# Altium schematic symbol library FPGA_Xilinx_Virtex7.SchLib: 34 symbols (part 4 of 34)
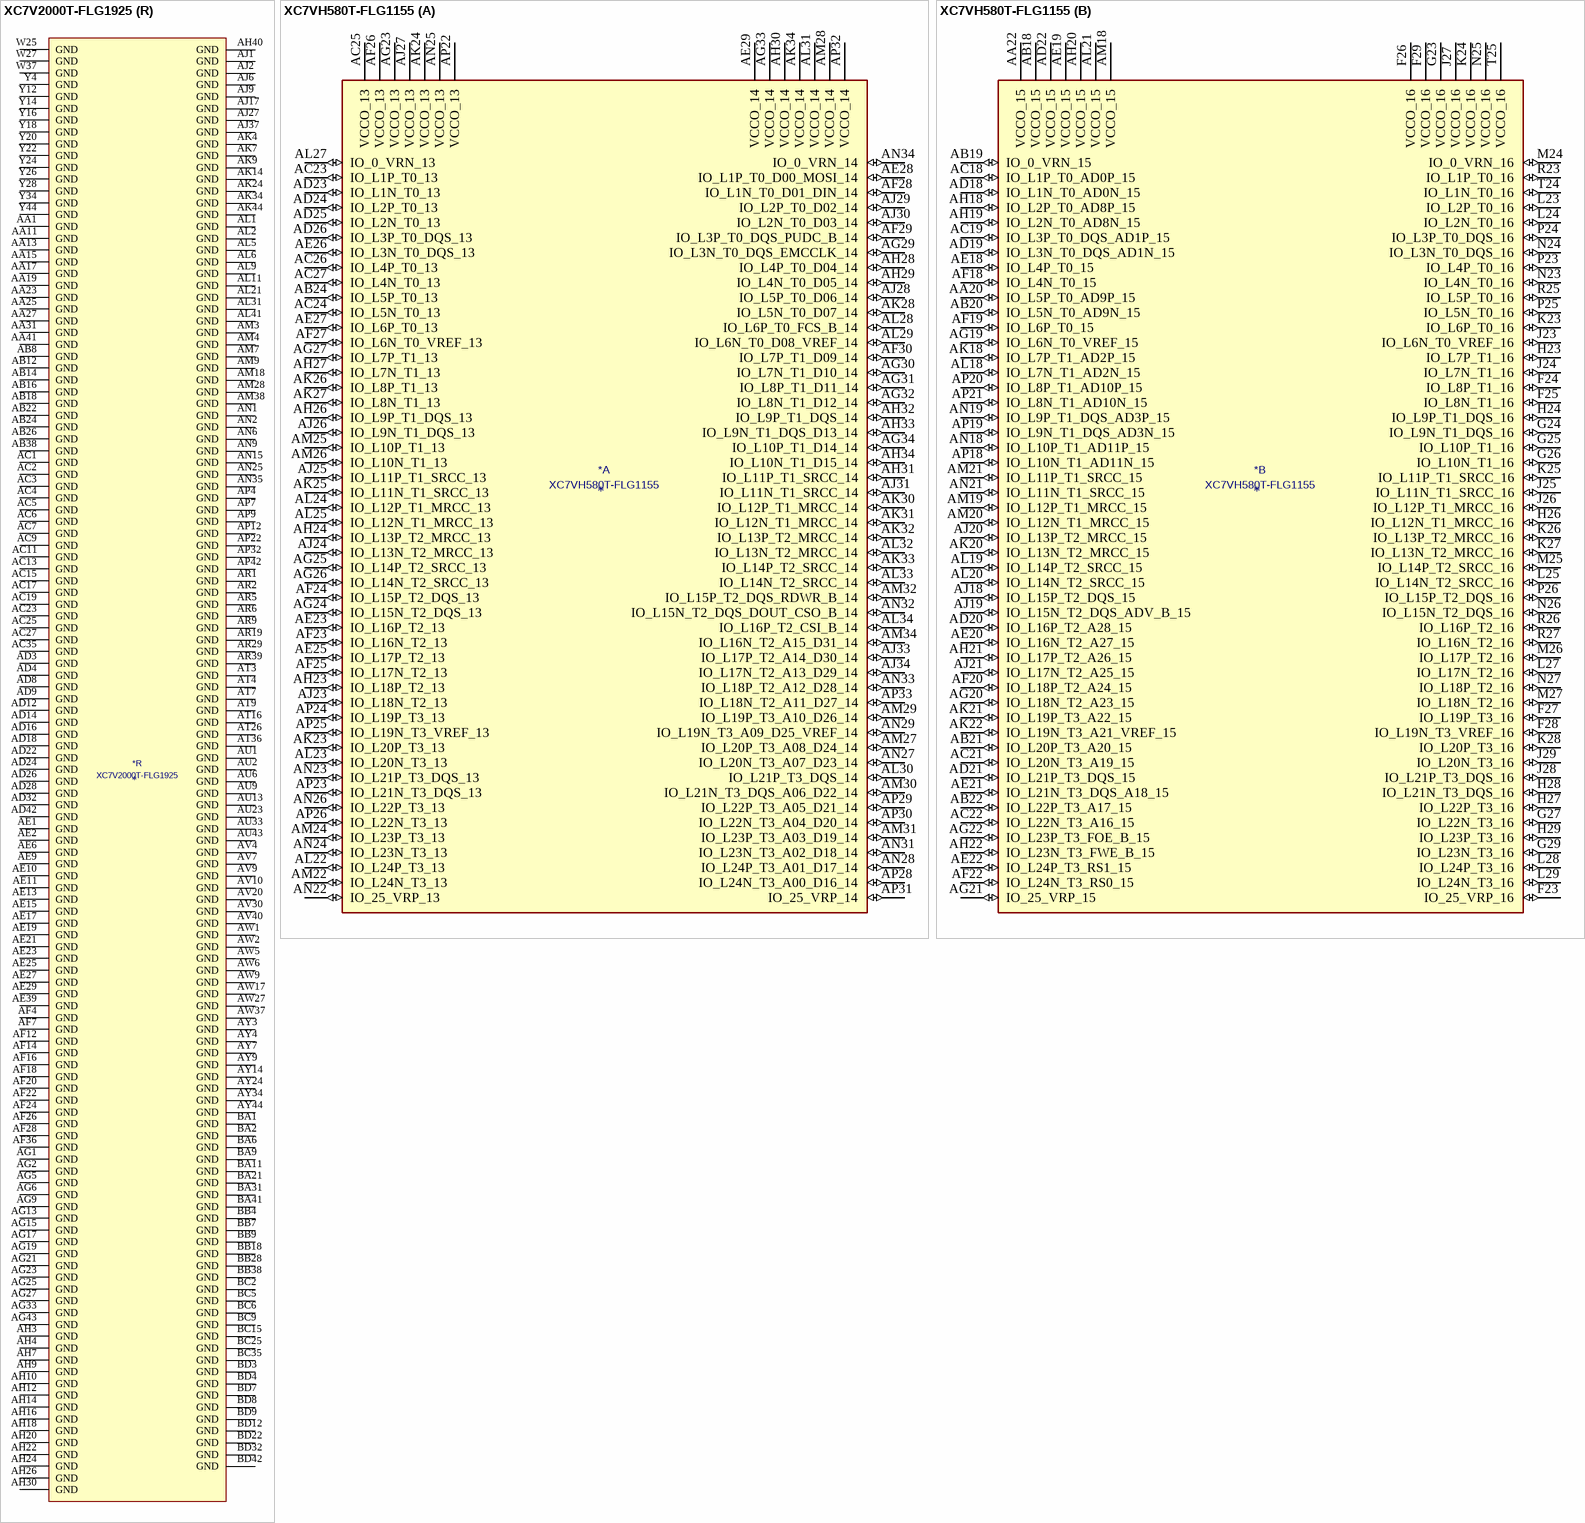
[diagram p175: symbols XC7V2000T-FLG1925 to XC7VH580T-FLG1155]

## XC7V2000T-FLG1925
designator *  value XC7V2000T-FLG1925
ki_keywords: FPGA; ki_description: Virtex 7 T 2000 XC7V2000T-FLG1925
part A pins: AN34 IO_0_VRN_12 (io), AN36 IO_L6P_T0_12 (io), AN37 IO_L2P_T0_12 (io), AN38 IO_L2N_T0_12 (io), AN39 IO_L7P_T1_12 (io), AN40 VCCO_12 (power), AN41 IO_L9P_T1_DQS_12 (io), AP34 IO_L3P_T0_DQS_12 (io), AP35 IO_L3N_T0_DQS_12 (io), AP36 IO_L6N_T0_VREF_12 (io), AP37 VCCO_12 (power), AP38 IO_L4P_T0_12 (io), AP39 IO_L4N_T0_12 (io), AP40 IO_L7N_T1_12 (io), AP41 IO_L9N_T1_DQS_12 (io), AP43 IO_L8P_T1_12 (io), AP44 IO_L8N_T1_12 (io), AR34 VCCO_12 (power), AR35 IO_L5P_T0_12 (io), AR36 IO_L5N_T0_12 (io), AR37 IO_L1P_T0_12 (io), AR38 IO_L1N_T0_12 (io), AR40 IO_L11P_T1_SRCC_12 (io), AR41 IO_L11N_T1_SRCC_12 (io), AR42 IO_L12P_T1_MRCC_12 (io), AR43 IO_L10P_T1_12 (io), AR44 VCCO_12 (power), AT34 IO_25_VRP_12 (io), AT35 IO_L20P_T3_12 (io), AT37 IO_L19P_T3_12 (io), AT38 IO_L19N_T3_VREF_12 (io), AT39 IO_L14P_T2_SRCC_12 (io), AT40 IO_L14N_T2_SRCC_12 (io), AT41 VCCO_12 (power), AT42 IO_L12N_T1_MRCC_12 (io), AT43 IO_L10N_T1_12 (io), AT44 IO_L16P_T2_12 (io), AU34 IO_L22P_T3_12 (io), AU35 IO_L20N_T3_12 (io), AU36 IO_L21P_T3_DQS_12 (io), AU37 IO_L21N_T3_DQS_12 (io), AU38 VCCO_12 (power), AU39 IO_L13P_T2_MRCC_12 (io), AU40 IO_L13N_T2_MRCC_12 (io), AU41 IO_L15P_T2_DQS_12 (io), AU42 IO_L17P_T2_12 (io), AU44 IO_L16N_T2_12 (io), AV34 IO_L22N_T3_12 (io), AV35 VCCO_12 (power), AV36 IO_L24P_T3_12 (io), AV37 IO_L24N_T3_12 (io), AV38 IO_L23P_T3_12 (io), AV39 IO_L23N_T3_12 (io), AV41 IO_L15N_T2_DQS_12 (io), AV42 IO_L17N_T2_12 (io), AV43 IO_L18P_T2_12 (io), AV44 IO_L18N_T2_12 (io), AW34 IO_25_VRP_11 (io), AW35 IO_L20P_T3_11 (io), AW36 IO_0_VRN_11 (io), AW38 IO_L15P_T2_DQS_11 (io), AW39 IO_L15N_T2_DQS_11 (io), AW40 IO_L1P_T0_11 (io), AW41 IO_L1N_T0_11 (io), AW42 VCCO_11 (power), AW43 IO_L3P_T0_DQS_11 (io), AW44 IO_L3N_T0_DQS_11 (io), AY35 IO_L20N_T3_11 (io), AY36 IO_L18P_T2_11 (io), AY37 IO_L18N_T2_11 (io), AY38 IO_L13P_T2_MRCC_11 (io), AY39 VCCO_11 (power), AY40 IO_L12P_T1_MRCC_11 (io), AY41 IO_L5P_T0_11 (io), AY42 IO_L5N_T0_11 (io), AY43 IO_L2P_T0_11 (io), BA34 IO_L19P_T3_11 (io), BA35 IO_L22P_T3_11 (io), BA36 VCCO_11 (power), BA37 IO_L14P_T2_SRCC_11 (io), BA38 IO_L14N_T2_SRCC_11 (io), BA39 IO_L13N_T2_MRCC_11 (io), BA40 IO_L12N_T1_MRCC_11 (io), BA42 IO_L6P_T0_11 (io), BA43 IO_L2N_T0_11 (io), BA44 IO_L4P_T0_11 (io), BB34 IO_L19N_T3_VREF_11 (io), BB35 IO_L22N_T3_11 (io), BB36 IO_L24P_T3_11 (io), BB37 IO_L16P_T2_11 (io), BB39 IO_L11P_T1_SRCC_11 (io), BB40 IO_L11N_T1_SRCC_11 (io), BB41 IO_L7P_T1_11 (io), BB42 IO_L6N_T0_VREF_11 (io), BB43 VCCO_11 (power), BB44 IO_L4N_T0_11 (io), BC34 IO_L23P_T3_11 (io), BC36 IO_L24N_T3_11 (io), BC37 IO_L16N_T2_11 (io), BC38 IO_L17P_T2_11 (io), BC39 IO_L10P_T1_11 (io), BC40 VCCO_11 (power), BC41 IO_L7N_T1_11 (io), BC42 IO_L9P_T1_DQS_11 (io), BC43 IO_L9N_T1_DQS_11 (io), BD34 IO_L23N_T3_11 (io), BD35 IO_L21P_T3_DQS_11 (io), BD36 IO_L21N_T3_DQS_11 (io), BD37 VCCO_11 (power), BD38 IO_L17N_T2_11 (io), BD39 IO_L10N_T1_11 (io), BD40 IO_L8P_T1_11 (io), BD41 IO_L8N_T1_11 (io)
part B pins: AD41 IO_L13P_T2_MRCC_14 (io), AD43 IO_L15P_T2_DQS_RDWR_B_14 (io), AD44 IO_L15N_T2_DQS_DOUT_CSO_B_14 (io), AE30 IO_L20P_T3_A08_D24_14 (io), AE31 IO_L20N_T3_A07_D23_14 (io), AE32 IO_L4P_T0_D04_14 (io), AE33 IO_L4N_T0_D05_14 (io), AE34 VCCO_14 (power), AE35 IO_L6P_T0_FCS_B_14 (io), AE36 IO_0_VRN_14 (io), AE37 IO_L8P_T1_D11_14 (io), AE38 IO_L8N_T1_D12_14 (io), AE40 IO_L12P_T1_MRCC_14 (io), AE41 IO_L13N_T2_MRCC_14 (io), AE42 IO_L14P_T2_SRCC_14 (io), AE43 IO_L17P_T2_A14_D30_14 (io), AE44 VCCO_14 (power), AF29 IO_L22P_T3_A05_D21_14 (io), AF30 IO_L22N_T3_A04_D20_14 (io), AF31 VCCO_14 (power), AF32 IO_L5P_T0_D06_14 (io), AF33 IO_L1P_T0_D00_MOSI_14 (io), AF34 IO_L1N_T0_D01_DIN_14 (io), AF35 IO_L6N_T0_D08_VREF_14 (io), AF37 IO_L10P_T1_D14_14 (io), AF38 IO_L10N_T1_D15_14 (io), AF39 IO_L11P_T1_SRCC_14 (io), AF40 IO_L12N_T1_MRCC_14 (io), AF41 VCCO_14 (power), AF42 IO_L14N_T2_SRCC_14 (io), AF43 IO_L17N_T2_A13_D29_14 (io), AF44 IO_L18P_T2_A12_D28_14 (io), AG29 IO_L19P_T3_A10_D26_14 (io), AG30 IO_L19N_T3_A09_D25_VREF_14 (io), AG31 IO_L24P_T3_A01_D17_14 (io), AG32 IO_L5N_T0_D07_14 (io), AG34 IO_L2P_T0_D02_14 (io), AG35 IO_L2N_T0_D03_14 (io), AG36 IO_L3P_T0_DQS_PUDC_B_14 (io), AG37 IO_L3N_T0_DQS_EMCCLK_14 (io), AG38 VCCO_14 (power), AG39 IO_L9P_T1_DQS_14 (io), AG40 IO_L11N_T1_SRCC_14 (io), AG41 IO_L7P_T1_D09_14 (io), AG42 IO_L16P_T2_CSI_B_14 (io), AG44 IO_L18N_T2_A11_D27_14 (io), AH28 IO_L21P_T3_DQS_14 (io), AH29 IO_L21N_T3_DQS_A06_D22_14 (io), AH31 IO_L24N_T3_A00_D16_14 (io), AH32 IO_L23P_T3_13 (io), AH33 IO_L23N_T3_13 (io), AH34 IO_0_VRN_13 (io), AH35 VCCO_13 (power), AH36 IO_L7P_T1_13 (io), AH37 IO_L8P_T1_13 (io), AH38 IO_L8N_T1_13 (io), AH39 IO_L9N_T1_DQS_D13_14 (io), AH41 IO_L7N_T1_D10_14 (io), AH42 IO_L16N_T2_A15_D31_14 (io), AH43 IO_L2P_T0_13 (io), AH44 IO_L2N_T0_13 (io), AJ28 IO_25_VRP_14 (io), AJ29 IO_L23P_T3_A03_D19_14 (io), AJ30 IO_L23N_T3_A02_D18_14 (io), AJ31 IO_25_VRP_13 (io), AJ32 VCCO_13 (power), AJ33 IO_L19P_T3_13 (io), AJ34 IO_L19N_T3_VREF_13 (io), AJ35 IO_L20P_T3_13 (io), AJ36 IO_L7N_T1_13 (io), AJ38 IO_L10P_T1_13 (io), AJ39 IO_L6P_T0_13 (io), AJ40 IO_L6N_T0_VREF_13 (io), AJ41 IO_L1P_T0_13 (io), AJ42 VCCO_13 (power), AJ43 IO_L4P_T0_13 (io), AJ44 IO_L4N_T0_13 (io), AK29 VCCO_14 (power), AK33 IO_L21P_T3_DQS_13 (io), AK35 IO_L20N_T3_13 (io), AK36 IO_L12P_T1_MRCC_13 (io), AK37 IO_L12N_T1_MRCC_13 (io), AK38 IO_L10N_T1_13 (io), AK39 VCCO_13 (power), AK40 IO_L5P_T0_13 (io), AK41 IO_L1N_T0_13 (io), AK42 IO_L3P_T0_DQS_13 (io), AK43 IO_L3N_T0_DQS_13 (io), AL33 IO_L21N_T3_DQS_13 (io), AL34 IO_L22P_T3_13 (io), AL35 IO_L24P_T3_13 (io), AL36 VCCO_13 (power), AL37 IO_L11P_T1_SRCC_13 (io), AL38 IO_L11N_T1_SRCC_13 (io), AL39 IO_L14P_T2_SRCC_13 (io), AL40 IO_L5N_T0_13 (io), AL42 IO_L16P_T2_13 (io), AL43 IO_L16N_T2_13 (io), AL44 IO_L18P_T2_13 (io), AM34 IO_L22N_T3_13 (io), AM35 IO_L24N_T3_13 (io), AM36 IO_L9P_T1_DQS_13 (io), AM37 IO_L9N_T1_DQS_13 (io), AM39 IO_L14N_T2_SRCC_13 (io), AM40 IO_L13P_T2_MRCC_13 (io), AM41 IO_L13N_T2_MRCC_13 (io), AM42 IO_L15P_T2_DQS_13 (io), AM43 VCCO_13 (power), AM44 IO_L18N_T2_13 (io), AN42 IO_L15N_T2_DQS_13 (io), AN43 IO_L17P_T2_13 (io), AN44 IO_L17N_T2_13 (io)
part C pins: AA29 IO_L21P_T3_DQS_15 (io), AA30 IO_L21N_T3_DQS_A18_15 (io), AA32 IO_L6P_T0_15 (io), AA33 IO_L6N_T0_VREF_15 (io), AA34 IO_L2N_T0_AD8N_15 (io), AA35 IO_0_VRN_15 (io), AA36 VCCO_15 (power), AA37 IO_L8N_T1_AD10N_15 (io), AA38 IO_L12P_T1_MRCC_15 (io), AA39 IO_L12N_T1_MRCC_15 (io), AA40 IO_L14N_T2_SRCC_15 (io), AA42 IO_L16P_T2_A28_15 (io), AA43 IO_L16N_T2_A27_15 (io), AA44 IO_L18N_T2_A23_15 (io), AB28 IO_25_VRP_15 (io), AB29 IO_L19P_T3_A22_15 (io), AB30 IO_L19N_T3_A21_VREF_15 (io), AB31 IO_L22P_T3_A17_15 (io), AB32 IO_L22N_T3_A16_15 (io), AB33 VCCO_15 (power), AB34 IO_L2P_T0_AD8P_15 (io), AB35 IO_L4P_T0_15 (io), AB36 IO_L4N_T0_15 (io), AB37 IO_L8P_T1_AD10P_15 (io), AB39 IO_L11N_T1_SRCC_15 (io), AB40 IO_L14P_T2_SRCC_15 (io), AB41 IO_L13N_T2_MRCC_15 (io), AB42 IO_L15N_T2_DQS_ADV_B_15 (io), AB43 VCCO_15 (power), AB44 IO_L18P_T2_A24_15 (io), AC29 IO_L23N_T3_FWE_B_15 (io), AC30 VCCO_15 (power), AC31 IO_L20P_T3_A20_15 (io), AC32 IO_L20N_T3_A19_15 (io), AC33 IO_L1P_T0_AD0P_15 (io), AC34 IO_L1N_T0_AD0N_15 (io), AC36 IO_L9P_T1_DQS_AD3P_15 (io), AC37 IO_L9N_T1_DQS_AD3N_15 (io), AC38 IO_L10N_T1_AD11N_15 (io), AC39 IO_L11P_T1_SRCC_15 (io), AC40 VCCO_15 (power), AC41 IO_L13P_T2_MRCC_15 (io), AC42 IO_L15P_T2_DQS_15 (io), AC43 IO_L17P_T2_A26_15 (io), AC44 IO_L17N_T2_A25_15 (io), AD29 IO_L23P_T3_FOE_B_15 (io), AD30 IO_L24P_T3_RS1_15 (io), AD31 IO_L24N_T3_RS0_15 (io), AD33 IO_L3P_T0_DQS_AD1P_15 (io), AD34 IO_L3N_T0_DQS_AD1N_15 (io), AD35 IO_L5P_T0_AD9P_15 (io), AD36 IO_L5N_T0_AD9N_15 (io), AD37 VCCO_15 (power), AD38 IO_L10P_T1_AD11P_15 (io), AD39 IO_L7P_T1_AD2P_15 (io), AD40 IO_L7N_T1_AD2N_15 (io), U29 IO_25_VRP_16 (io), U30 IO_L20P_T3_16 (io), U31 IO_L20N_T3_16 (io), U32 IO_0_VRN_16 (io), U34 IO_L2P_T0_16 (io), U35 IO_L2N_T0_16 (io), U36 IO_L4P_T0_16 (io), U37 IO_L4N_T0_16 (io), U38 VCCO_16 (power), U39 IO_L9P_T1_DQS_16 (io), U40 IO_L9N_T1_DQS_16 (io), U41 IO_L15P_T2_DQS_16 (io), U42 IO_L15N_T2_DQS_16 (io), V29 IO_L24N_T3_16 (io), V31 IO_L19P_T3_16 (io), V32 IO_L19N_T3_VREF_16 (io), V33 IO_L1P_T0_16 (io), V34 IO_L1N_T0_16 (io), V35 VCCO_16 (power), V36 IO_L8P_T1_16 (io), V37 IO_L8N_T1_16 (io), V38 IO_L7P_T1_16 (io), V39 IO_L7N_T1_16 (io), V41 IO_L13P_T2_MRCC_16 (io), V42 IO_L13N_T2_MRCC_16 (io), V43 IO_L17P_T2_16 (io), V44 IO_L17N_T2_16 (io), W29 IO_L24P_T3_16 (io), W30 IO_L22P_T3_16 (io), W31 IO_L22N_T3_16 (io), W32 VCCO_16 (power), W33 IO_L3P_T0_DQS_16 (io), W34 IO_L3N_T0_DQS_16 (io), W35 IO_L6P_T0_16 (io), W36 IO_L6N_T0_VREF_16 (io), W38 IO_L12P_T1_MRCC_16 (io), W39 IO_L12N_T1_MRCC_16 (io), W40 IO_L11N_T1_SRCC_16 (io), W41 IO_L14N_T2_SRCC_16 (io), W42 VCCO_16 (power), W43 IO_L18P_T2_16 (io), W44 IO_L18N_T2_16 (io), Y29 VCCO_16 (power), Y30 IO_L23P_T3_16 (io), Y31 IO_L23N_T3_16 (io), Y32 IO_L21P_T3_DQS_16 (io), Y33 IO_L21N_T3_DQS_16 (io), Y35 IO_L5P_T0_16 (io), Y36 IO_L5N_T0_16 (io), Y37 IO_L10P_T1_16 (io), Y38 IO_L10N_T1_16 (io), Y39 VCCO_16 (power), Y40 IO_L11P_T1_SRCC_16 (io), Y41 IO_L14P_T2_SRCC_16 (io), Y42 IO_L16P_T2_16 (io), Y43 IO_L16N_T2_16 (io)
part D pins: A22 IO_L17N_T2_17 (io), A23 IO_L17P_T2_17 (io), A24 IO_L18N_T2_17 (io), A25 IO_L17N_T2_18 (io), A26 VCCO_18 (power), A27 IO_L18P_T2_18 (io), A28 IO_L18N_T2_18 (io), B22 IO_L15N_T2_DQS_17 (io), B23 VCCO_17 (power), B24 IO_L18P_T2_17 (io), B25 IO_L17P_T2_18 (io), B26 IO_L16P_T2_18 (io), B27 IO_L16N_T2_18 (io), C22 IO_L15P_T2_DQS_17 (io), C23 IO_L13N_T2_MRCC_17 (io), C24 IO_L14N_T2_SRCC_17 (io), C26 IO_L15N_T2_DQS_18 (io), C27 IO_L14P_T2_SRCC_18 (io), C28 IO_L14N_T2_SRCC_18 (io), D23 IO_L13P_T2_MRCC_17 (io), D24 IO_L14P_T2_SRCC_17 (io), D25 IO_L16N_T2_17 (io), D26 IO_L15P_T2_DQS_18 (io), D27 VCCO_18 (power), D28 IO_L13P_T2_MRCC_18 (io), D29 IO_L13N_T2_MRCC_18 (io), E22 IO_L11N_T1_SRCC_17 (io), E23 IO_L12N_T1_MRCC_17 (io), E24 VCCO_17 (power), E25 IO_L16P_T2_17 (io), E26 IO_L11P_T1_SRCC_18 (io), E27 IO_L11N_T1_SRCC_18 (io), E28 IO_L12N_T1_MRCC_18 (io), F22 IO_L11P_T1_SRCC_17 (io), F23 IO_L12P_T1_MRCC_17 (io), F24 IO_L9N_T1_DQS_17 (io), F25 IO_L10N_T1_17 (io), F27 IO_L9N_T1_DQS_18 (io), F28 IO_L12P_T1_MRCC_18 (io), F29 IO_L7N_T1_18 (io), G22 IO_L20N_T3_17 (io), G24 IO_L9P_T1_DQS_17 (io), G25 IO_L10P_T1_17 (io), G26 IO_L10N_T1_18 (io), G27 IO_L9P_T1_DQS_18 (io), G28 VCCO_18 (power), G29 IO_L7P_T1_18 (io), H21 IO_L24N_T3_17 (io), H22 IO_L20P_T3_17 (io), H23 IO_L7N_T1_17 (io), H24 IO_L8N_T1_17 (io), H25 VCCO_18 (power), H26 IO_L10P_T1_18 (io), H27 IO_L8P_T1_18 (io), H28 IO_L8N_T1_18 (io), J21 IO_L24P_T3_17 (io), J22 VCCO_17 (power), J23 IO_L7P_T1_17 (io), J24 IO_L8P_T1_17 (io), J25 IO_25_VRP_18 (io), J26 IO_L23N_T3_18 (io), J28 IO_L22N_T3_18 (io), K21 IO_L23N_T3_17 (io), K22 IO_L23P_T3_17 (io), K23 IO_L19N_T3_VREF_17 (io), K25 IO_L21N_T3_DQS_18 (io), K26 IO_L23P_T3_18 (io), K27 IO_L20N_T3_18 (io), K28 IO_L22P_T3_18 (io), L22 IO_L22N_T3_17 (io), L23 IO_L19P_T3_17 (io), L24 IO_L21N_T3_DQS_17 (io), L25 IO_L21P_T3_DQS_18 (io), L26 VCCO_18 (power), L27 IO_L20P_T3_18 (io), L28 IO_L19N_T3_VREF_18 (io), M21 IO_25_VRP_17 (io), M22 IO_L22P_T3_17 (io), M23 VCCO_17 (power), M24 IO_L21P_T3_DQS_17 (io), M25 IO_L24P_T3_18 (io), M26 IO_L24N_T3_18 (io), M27 IO_L19P_T3_18 (io), N21 IO_L3N_T0_DQS_17 (io), N22 IO_L3P_T0_DQS_17 (io), N23 IO_L5N_T0_17 (io), N24 IO_L1N_T0_17 (io), N26 IO_L4P_T0_18 (io), N27 IO_L4N_T0_18 (io), N28 IO_L5N_T0_18 (io), P21 IO_L6N_T0_VREF_17 (io), P23 IO_L5P_T0_17 (io), P24 IO_L1P_T0_17 (io), P25 IO_L6N_T0_VREF_18 (io), P26 IO_L2N_T0_18 (io), P27 VCCO_18 (power), P28 IO_L5P_T0_18 (io), R21 IO_L6P_T0_17 (io), R22 IO_L4N_T0_17 (io), R23 IO_L2N_T0_17 (io), R24 VCCO_17 (power), R25 IO_L6P_T0_18 (io), R26 IO_L2P_T0_18 (io), R27 IO_L3N_T0_DQS_18 (io), R28 IO_L1N_T0_18 (io), T21 VCCO_17 (power), T22 IO_L4P_T0_17 (io), T23 IO_L2P_T0_17 (io), T24 IO_0_VRN_17 (io), T25 IO_0_VRN_18 (io), T27 IO_L3P_T0_DQS_18 (io), T28 IO_L1P_T0_18 (io)
part E pins: A29 IO_L17P_T2_19 (io), A30 IO_L17N_T2_19 (io), A32 IO_L15P_T2_DQS_19 (io), A33 IO_L15N_T2_DQS_19 (io), B29 IO_L18N_T2_19 (io), B30 IO_L16P_T2_19 (io), B31 IO_L16N_T2_19 (io), B32 IO_L9N_T1_DQS_19 (io), B33 VCCO_19 (power), C29 IO_L18P_T2_19 (io), C30 VCCO_19 (power), C31 IO_L13N_T2_MRCC_19 (io), C32 IO_L9P_T1_DQS_19 (io), C33 IO_L7N_T1_19 (io), D30 IO_L13P_T2_MRCC_19 (io), D31 IO_L12N_T1_MRCC_19 (io), D33 IO_L7P_T1_19 (io), E30 IO_L14N_T2_SRCC_19 (io), E31 IO_L12P_T1_MRCC_19 (io), E32 IO_L11N_T1_SRCC_19 (io), E33 IO_L10N_T1_19 (io), F30 IO_L14P_T2_SRCC_19 (io), F31 VCCO_19 (power), F32 IO_L11P_T1_SRCC_19 (io), F33 IO_L10P_T1_19 (io), G30 IO_L24N_T3_19 (io), G31 IO_L8P_T1_19 (io), G32 IO_L8N_T1_19 (io), H29 IO_L24P_T3_19 (io), H31 IO_L19P_T3_19 (io), H32 IO_L19N_T3_VREF_19 (io), H33 IO_L20N_T3_19 (io), J29 IO_25_VRP_19 (io), J30 IO_L21N_T3_DQS_19 (io), J31 IO_L22N_T3_19 (io), J32 VCCO_19 (power), J33 IO_L20P_T3_19 (io), K29 VCCO_19 (power), K30 IO_L21P_T3_DQS_19 (io), K31 IO_L22P_T3_19 (io), K32 IO_L23P_T3_19 (io), K33 IO_L23N_T3_19 (io), L29 IO_L5P_T0_19 (io), L30 IO_L5N_T0_19 (io), L32 IO_L2P_T0_19 (io), L33 IO_L2N_T0_19 (io), M29 IO_L3N_T0_DQS_19 (io), M30 IO_L1P_T0_19 (io), M31 IO_L1N_T0_19 (io), M32 IO_L6N_T0_VREF_19 (io), M33 VCCO_19 (power), M39 IO_L6P_T0_20 (io), M40 IO_L6N_T0_VREF_20 (io), M41 IO_L8N_T1_20 (io), N29 IO_L3P_T0_DQS_19 (io), N30 VCCO_19 (power), N31 IO_L6P_T0_19 (io), N32 IO_L4P_T0_19 (io), N33 IO_L4N_T0_19 (io), N34 IO_0_VRN_20 (io), N36 IO_L2P_T0_20 (io), N37 IO_L2N_T0_20 (io), N38 IO_L4P_T0_20 (io), N39 IO_L4N_T0_20 (io), N40 VCCO_20 (power), N41 IO_L8P_T1_20 (io), N42 IO_L10N_T1_20 (io), N43 IO_L15N_T2_DQS_20 (io), N44 IO_L17N_T2_20 (io), P29 IO_0_VRN_19 (io), P30 IO_L24P_T3_20 (io), P31 IO_L24N_T3_20 (io), P33 IO_L20P_T3_20 (io), P34 IO_L20N_T3_20 (io), P35 IO_L1P_T0_20 (io), P36 IO_L1N_T0_20 (io), P37 VCCO_20 (power), P38 IO_L12N_T1_MRCC_20 (io), P39 IO_L11P_T1_SRCC_20 (io), P40 IO_L11N_T1_SRCC_20 (io), P41 IO_L10P_T1_20 (io), P43 IO_L15P_T2_DQS_20 (io), P44 IO_L17P_T2_20 (io), R30 IO_L21P_T3_DQS_20 (io), R31 IO_L21N_T3_DQS_20 (io), R32 IO_L22P_T3_20 (io), R33 IO_L22N_T3_20 (io), R34 VCCO_20 (power), R35 IO_L3N_T0_DQS_20 (io), R36 IO_L5P_T0_20 (io), R37 IO_L5N_T0_20 (io), R38 IO_L12P_T1_MRCC_20 (io), R40 IO_L13P_T2_MRCC_20 (io), R41 IO_L13N_T2_MRCC_20 (io), R42 IO_L14N_T2_SRCC_20 (io), R43 IO_L16N_T2_20 (io), R44 VCCO_20 (power), T29 IO_L23P_T3_20 (io), T30 IO_L23N_T3_20 (io), T31 VCCO_20 (power), T32 IO_25_VRP_20 (io), T33 IO_L19P_T3_20 (io), T34 IO_L19N_T3_VREF_20 (io), T35 IO_L3P_T0_DQS_20 (io), T37 IO_L9P_T1_DQS_20 (io), T38 IO_L9N_T1_DQS_20 (io), T39 IO_L7P_T1_20 (io), T40 IO_L7N_T1_20 (io), T41 VCCO_20 (power), T42 IO_L14P_T2_SRCC_20 (io), T43 IO_L16P_T2_20 (io), T44 IO_L18N_T2_20 (io), U44 IO_L18P_T2_20 (io)
part F pins: A34 IO_L4N_T0_22 (io), A35 IO_L1N_T0_22 (io), A36 VCCO_22 (power), A37 IO_L8P_T1_22 (io), A38 IO_L8N_T1_22 (io), A39 IO_L18P_T2_22 (io), A40 IO_L18N_T2_22 (io), A42 IO_L15N_T2_DQS_22 (io), B34 IO_L4P_T0_22 (io), B35 IO_L1P_T0_22 (io), B36 IO_L5N_T0_22 (io), B37 IO_L10N_T1_22 (io), B39 IO_L16P_T2_22 (io), B40 IO_L16N_T2_22 (io), B41 IO_L15P_T2_DQS_22 (io), B42 IO_L17N_T2_22 (io), B43 VCCO_22 (power), C34 IO_L2N_T0_22 (io), C36 IO_L5P_T0_22 (io), C37 IO_L10P_T1_22 (io), C38 IO_L12P_T1_MRCC_22 (io), C39 IO_L12N_T1_MRCC_22 (io), C40 VCCO_22 (power), C41 IO_L13N_T2_MRCC_22 (io), C42 IO_L17P_T2_22 (io), C43 IO_L22P_T3_22 (io), C44 IO_L22N_T3_22 (io), D34 IO_L2P_T0_22 (io), D35 IO_L3P_T0_DQS_22 (io), D36 IO_L3N_T0_DQS_22 (io), D37 VCCO_22 (power), D38 IO_L11N_T1_SRCC_22 (io), D39 IO_L14P_T2_SRCC_22 (io), D40 IO_L14N_T2_SRCC_22 (io), D41 IO_L13P_T2_MRCC_22 (io), D43 IO_L21P_T3_DQS_22 (io), D44 IO_L21N_T3_DQS_22 (io), E34 VCCO_22 (power), E35 IO_L6N_T0_VREF_22 (io), E36 IO_L7P_T1_22 (io), E37 IO_L7N_T1_22 (io), E38 IO_L11P_T1_SRCC_22 (io), E40 IO_L19N_T3_VREF_22 (io), E41 IO_L20P_T3_22 (io), E42 IO_L20N_T3_22 (io), E43 IO_L24N_T3_22 (io), E44 VCCO_22 (power), F34 IO_0_VRN_22 (io), F35 IO_L6P_T0_22 (io), F37 IO_25_VRP_22 (io), F38 IO_L9P_T1_DQS_22 (io), F39 IO_L9N_T1_DQS_22 (io), F40 IO_L19P_T3_22 (io), F41 VCCO_22 (power), F42 IO_L24P_T3_22 (io), F43 IO_L23P_T3_22 (io), F44 IO_L23N_T3_22 (io), G34 IO_L2P_T0_21 (io), G35 IO_L2N_T0_21 (io), G36 IO_L4P_T0_21 (io), G37 IO_L4N_T0_21 (io), G38 VCCO_21 (power), G39 IO_L1P_T0_21 (io), G40 IO_L1N_T0_21 (io), G41 IO_L7P_T1_21 (io), G42 IO_L7N_T1_21 (io), G44 IO_L16N_T2_21 (io), H34 IO_0_VRN_21 (io), H35 VCCO_21 (power), H36 IO_L6P_T0_21 (io), H37 IO_L6N_T0_VREF_21 (io), H38 IO_L5N_T0_21 (io), H39 IO_L3N_T0_DQS_21 (io), H41 IO_L11N_T1_SRCC_21 (io), H42 IO_L9P_T1_DQS_21 (io), H43 IO_L9N_T1_DQS_21 (io), H44 IO_L16P_T2_21 (io), J34 IO_L22P_T3_21 (io), J35 IO_L22N_T3_21 (io), J36 IO_L19N_T3_VREF_21 (io), J38 IO_L5P_T0_21 (io), J39 IO_L3P_T0_DQS_21 (io), J40 IO_L12N_T1_MRCC_21 (io), J41 IO_L11P_T1_SRCC_21 (io), J42 VCCO_21 (power), J43 IO_L18P_T2_21 (io), J44 IO_L18N_T2_21 (io), K35 IO_25_VRP_21 (io), K36 IO_L19P_T3_21 (io), K37 IO_L20N_T3_21 (io), K38 IO_L10N_T1_21 (io), K39 VCCO_21 (power), K40 IO_L12P_T1_MRCC_21 (io), K41 IO_L14P_T2_SRCC_21 (io), K42 IO_L14N_T2_SRCC_21 (io), K43 IO_L15N_T2_DQS_21 (io), L34 IO_L23P_T3_21 (io), L35 IO_L23N_T3_21 (io), L36 VCCO_21 (power), L37 IO_L20P_T3_21 (io), L38 IO_L10P_T1_21 (io), L39 IO_L8P_T1_21 (io), L40 IO_L8N_T1_21 (io), L42 IO_L13N_T2_MRCC_21 (io), L43 IO_L15P_T2_DQS_21 (io), L44 IO_L17N_T2_21 (io), M34 IO_L24P_T3_21 (io), M35 IO_L24N_T3_21 (io), M36 IO_L21P_T3_DQS_21 (io), M37 IO_L21N_T3_DQS_21 (io), M42 IO_L13P_T2_MRCC_21 (io), M43 VCCO_21 (power), M44 IO_L17P_T2_21 (io)
part G pins: AJ10 IO_L2N_T0_31 (io), AJ11 IO_L2P_T0_31 (io), AJ12 VCCO_31 (power), AJ13 IO_0_VRN_31 (io), AJ14 IO_25_VRP_32 (io), AJ15 IO_L23N_T3_32 (io), AJ16 IO_L23P_T3_32 (io), AK10 IO_L6N_T0_VREF_31 (io), AK11 IO_L6P_T0_31 (io), AK12 IO_L4N_T0_31 (io), AK13 IO_L4P_T0_31 (io), AK15 IO_L21N_T3_DQS_32 (io), AK16 IO_L21P_T3_DQS_32 (io), AL10 IO_L5P_T0_31 (io), AL12 IO_L3N_T0_DQS_31 (io), AL13 IO_L3P_T0_DQS_31 (io), AL14 IO_L24N_T3_32 (io), AL15 IO_L24P_T3_32 (io), AL16 VCCO_32 (power), AM10 IO_L5N_T0_31 (io), AM11 IO_L1N_T0_31 (io), AM12 IO_L1P_T0_31 (io), AM13 VCCO_31 (power), AM14 IO_L22N_T3_32 (io), AM15 IO_L22P_T3_32 (io), AM16 IO_L19N_T3_VREF_32 (io), AM17 IO_L19P_T3_32 (io), AN10 VCCO_31 (power), AN11 IO_L9N_T1_DQS_31 (io), AN12 IO_L9P_T1_DQS_31 (io), AN13 IO_L10P_T1_31 (io), AN14 IO_L20P_T3_32 (io), AN16 IO_L17N_T2_32 (io), AN17 IO_L17P_T2_32 (io), AP10 IO_L7P_T1_31 (io), AP11 IO_L11P_T1_SRCC_31 (io), AP13 IO_L10N_T1_31 (io), AP14 IO_L20N_T3_32 (io), AP15 IO_L15N_T2_DQS_32 (io), AP16 IO_L15P_T2_DQS_32 (io), AP17 VCCO_32 (power), AR10 IO_L7N_T1_31 (io), AR11 IO_L11N_T1_SRCC_31 (io), AR12 IO_L12P_T1_MRCC_31 (io), AR13 IO_L8P_T1_31 (io), AR14 VCCO_32 (power), AR15 IO_L18N_T2_32 (io), AR16 IO_L18P_T2_32 (io), AR17 IO_L16P_T2_32 (io), AT10 IO_L15P_T2_DQS_31 (io), AT11 VCCO_31 (power), AT12 IO_L12N_T1_MRCC_31 (io), AT13 IO_L8N_T1_31 (io), AT14 IO_L10P_T1_32 (io), AT15 IO_L13P_T2_MRCC_32 (io), AT17 IO_L16N_T2_32 (io), AU10 IO_L15N_T2_DQS_31 (io), AU11 IO_L13N_T2_MRCC_31 (io), AU12 IO_L13P_T2_MRCC_31 (io), AU14 IO_L10N_T1_32 (io), AU15 IO_L13N_T2_MRCC_32 (io), AU16 IO_L14N_T2_SRCC_32 (io), AU17 IO_L14P_T2_SRCC_32 (io), AV11 IO_L14N_T2_SRCC_31 (io), AV12 IO_L14P_T2_SRCC_31 (io), AV13 IO_25_VRP_31 (io), AV14 IO_L8P_T1_32 (io), AV15 VCCO_32 (power), AV16 IO_L11P_T1_SRCC_32 (io), AV17 IO_0_VRN_32 (io), AW10 IO_L17P_T2_31 (io), AW11 IO_L16P_T2_31 (io), AW12 VCCO_31 (power), AW13 IO_L18P_T2_31 (io), AW14 IO_L8N_T1_32 (io), AW15 IO_L11N_T1_SRCC_32 (io), AW16 IO_L12P_T1_MRCC_32 (io), AY10 IO_L17N_T2_31 (io), AY11 IO_L16N_T2_31 (io), AY12 IO_L21P_T3_DQS_31 (io), AY13 IO_L18N_T2_31 (io), AY15 IO_L9P_T1_DQS_32 (io), AY16 IO_L12N_T1_MRCC_32 (io), AY17 IO_L7P_T1_32 (io), BA10 IO_L19P_T3_31 (io), BA12 IO_L21N_T3_DQS_31 (io), BA13 IO_L6N_T0_VREF_32 (io), BA14 IO_L6P_T0_32 (io), BA15 IO_L9N_T1_DQS_32 (io), BA16 VCCO_32 (power), BA17 IO_L7N_T1_32 (io), BB10 IO_L19N_T3_VREF_31 (io), BB11 IO_L20P_T3_31 (io), BB12 IO_L23P_T3_31 (io), BB13 VCCO_31 (power), BB14 IO_L4N_T0_32 (io), BB15 IO_L4P_T0_32 (io), BB16 IO_L1N_T0_32 (io), BB17 IO_L1P_T0_32 (io), BC10 VCCO_31 (power), BC11 IO_L20N_T3_31 (io), BC12 IO_L23N_T3_31 (io), BC13 IO_L24P_T3_31 (io), BC14 IO_L2P_T0_32 (io), BC16 IO_L3N_T0_DQS_32 (io), BC17 IO_L3P_T0_DQS_32 (io), BD10 IO_L22N_T3_31 (io), BD11 IO_L22P_T3_31 (io), BD13 IO_L24N_T3_31 (io), BD14 IO_L2N_T0_32 (io), BD15 IO_L5N_T0_32 (io), BD16 IO_L5P_T0_32 (io), BD17 VCCO_32 (power)
part H pins: AJ18 IO_25_VRP_33 (io), AJ19 IO_L23N_T3_33 (io), AJ20 IO_L23P_T3_33 (io), AJ21 IO_25_VRP_34 (io), AJ22 VCCO_34 (power), AJ23 IO_L24P_T3_34 (io), AJ24 IO_L24N_T3_34 (io), AK17 IO_L21P_T3_DQS_33 (io), AK18 IO_L19P_T3_33 (io), AK19 VCCO_33 (power), AK20 IO_L22P_T3_33 (io), AK21 IO_L20P_T3_34 (io), AK22 IO_L20N_T3_34 (io), AK23 IO_L22P_T3_34 (io), AL17 IO_L21N_T3_DQS_33 (io), AL18 IO_L19N_T3_VREF_33 (io), AL19 IO_L24P_T3_33 (io), AL20 IO_L22N_T3_33 (io), AL22 IO_L23P_T3_34 (io), AL23 IO_L22N_T3_34 (io), AL24 IO_L19P_T3_34 (io), AM19 IO_L24N_T3_33 (io), AM20 IO_L20P_T3_33 (io), AM21 IO_L21P_T3_DQS_34 (io), AM22 IO_L23N_T3_34 (io), AM23 VCCO_34 (power), AM24 IO_L19N_T3_VREF_34 (io), AN18 IO_L16P_T2_33 (io), AN19 IO_L20N_T3_33 (io), AN20 VCCO_33 (power), AN21 IO_L21N_T3_DQS_34 (io), AN22 IO_L18P_T2_34 (io), AN23 IO_L18N_T2_34 (io), AN24 IO_L17P_T2_34 (io), AP18 IO_L16N_T2_33 (io), AP19 IO_L17N_T2_33 (io), AP20 IO_L17P_T2_33 (io), AP21 IO_L15P_T2_DQS_33 (io), AP23 IO_L14P_T2_SRCC_34 (io), AP24 IO_L17N_T2_34 (io), AR18 IO_L18P_T2_33 (io), AR20 IO_L13P_T2_MRCC_33 (io), AR21 IO_L15N_T2_DQS_33 (io), AR22 IO_L15P_T2_DQS_34 (io), AR23 IO_L14N_T2_SRCC_34 (io), AR24 VCCO_34 (power), AR25 IO_L16P_T2_34 (io), AT18 IO_L18N_T2_33 (io), AT19 IO_L11P_T1_SRCC_33 (io), AT20 IO_L13N_T2_MRCC_33 (io), AT21 VCCO_33 (power), AT22 IO_L15N_T2_DQS_34 (io), AT23 IO_L13P_T2_MRCC_34 (io), AT24 IO_L13N_T2_MRCC_34 (io), AT25 IO_L16N_T2_34 (io), AU18 VCCO_33 (power), AU19 IO_L11N_T1_SRCC_33 (io), AU20 IO_L14N_T2_SRCC_33 (io), AU21 IO_L14P_T2_SRCC_33 (io), AU22 IO_L9P_T1_DQS_34 (io), AU24 IO_L11P_T1_SRCC_34 (io), AU25 IO_L11N_T1_SRCC_34 (io), AV18 IO_L12N_T1_MRCC_33 (io), AV19 IO_L12P_T1_MRCC_33 (io), AV21 IO_0_VRN_33 (io), AV22 IO_L9N_T1_DQS_34 (io), AV23 IO_L7P_T1_34 (io), AV24 IO_L12P_T1_MRCC_34 (io), AV25 VCCO_34 (power), AW18 IO_L10N_T1_33 (io), AW19 IO_L10P_T1_33 (io), AW20 IO_L9P_T1_DQS_33 (io), AW21 IO_L7P_T1_33 (io), AW22 VCCO_34 (power), AW23 IO_L7N_T1_34 (io), AW24 IO_L12N_T1_MRCC_34 (io), AW25 IO_0_VRN_34 (io), AY18 IO_L8P_T1_33 (io), AY19 VCCO_33 (power), AY20 IO_L9N_T1_DQS_33 (io), AY21 IO_L7N_T1_33 (io), AY22 IO_L10P_T1_34 (io), AY23 IO_L10N_T1_34 (io), AY25 IO_L8P_T1_34 (io), BA18 IO_L8N_T1_33 (io), BA19 IO_L6P_T0_33 (io), BA20 IO_L2P_T0_33 (io), BA22 IO_L6P_T0_34 (io), BA23 IO_L6N_T0_VREF_34 (io), BA24 IO_L2P_T0_34 (io), BA25 IO_L8N_T1_34 (io), BB19 IO_L6N_T0_VREF_33 (io), BB20 IO_L2N_T0_33 (io), BB21 IO_L1P_T0_33 (io), BB22 IO_L4P_T0_34 (io), BB23 VCCO_34 (power), BB24 IO_L1P_T0_34 (io), BB25 IO_L2N_T0_34 (io), BC18 IO_L4P_T0_33 (io), BC19 IO_L5P_T0_33 (io), BC20 VCCO_33 (power), BC21 IO_L1N_T0_33 (io), BC22 IO_L4N_T0_34 (io), BC23 IO_L5P_T0_34 (io), BC24 IO_L1N_T0_34 (io), BD18 IO_L4N_T0_33 (io), BD19 IO_L5N_T0_33 (io), BD20 IO_L3N_T0_DQS_33 (io), BD21 IO_L3P_T0_DQS_33 (io), BD23 IO_L5N_T0_34 (io), BD24 IO_L3P_T0_DQS_34 (io), BD25 IO_L3N_T0_DQS_34 (io)
part I pins: AJ25 IO_L24P_T3_35 (io), AJ26 IO_L22P_T3_35 (io), AK25 IO_L24N_T3_35 (io), AK26 IO_L22N_T3_35 (io), AK27 IO_L20P_T3_35 (io), AK28 IO_25_VRP_35 (io), AK30 IO_L21P_T3_DQS_36 (io), AK31 IO_L21N_T3_DQS_36 (io), AK32 IO_25_VRP_36 (io), AL25 IO_L21P_T3_DQS_35 (io), AL26 VCCO_35 (power), AL27 IO_L23P_T3_35 (io), AL28 IO_L20N_T3_35 (io), AL29 IO_L23P_T3_36 (io), AL30 IO_L23N_T3_36 (io), AL32 IO_L19P_T3_36 (io), AM25 IO_L21N_T3_DQS_35 (io), AM26 IO_L19P_T3_35 (io), AM27 IO_L23N_T3_35 (io), AM29 IO_L24P_T3_36 (io), AM30 IO_L22P_T3_36 (io), AM31 IO_L22N_T3_36 (io), AM32 IO_L19N_T3_VREF_36 (io), AM33 VCCO_36 (power), AN26 IO_L19N_T3_VREF_35 (io), AN27 IO_L18P_T2_35 (io), AN28 IO_L18N_T2_35 (io), AN29 IO_L24N_T3_36 (io), AN30 VCCO_36 (power), AN31 IO_L20P_T3_36 (io), AN32 IO_L20N_T3_36 (io), AN33 IO_L16P_T2_36 (io), AP25 IO_L17P_T2_35 (io), AP26 IO_L17N_T2_35 (io), AP27 VCCO_35 (power), AP28 IO_L15P_T2_DQS_35 (io), AP29 IO_L17P_T2_36 (io), AP30 IO_L17N_T2_36 (io), AP31 IO_L13P_T2_MRCC_36 (io), AP33 IO_L16N_T2_36 (io), AR26 IO_L13P_T2_MRCC_35 (io), AR27 IO_L13N_T2_MRCC_35 (io), AR28 IO_L15N_T2_DQS_35 (io), AR30 IO_L18P_T2_36 (io), AR31 IO_L13N_T2_MRCC_36 (io), AR32 IO_L14P_T2_SRCC_36 (io), AR33 IO_L15P_T2_DQS_36 (io), AT27 IO_L14P_T2_SRCC_35 (io), AT28 IO_L14N_T2_SRCC_35 (io), AT29 IO_L16P_T2_35 (io), AT30 IO_L18N_T2_36 (io), AT31 VCCO_36 (power), AT32 IO_L14N_T2_SRCC_36 (io), AT33 IO_L15N_T2_DQS_36 (io), AU26 IO_L12P_T1_MRCC_35 (io), AU27 IO_L12N_T1_MRCC_35 (io), AU28 VCCO_35 (power), AU29 IO_L16N_T2_35 (io), AU30 IO_L12P_T1_MRCC_36 (io), AU31 IO_L12N_T1_MRCC_36 (io), AU32 IO_L11P_T1_SRCC_36 (io), AV26 IO_L10P_T1_AD15P_35 (io), AV27 IO_L11P_T1_SRCC_35 (io), AV28 IO_L11N_T1_SRCC_35 (io), AV29 IO_0_VRN_35 (io), AV31 IO_L10P_T1_36 (io), AV32 IO_L11N_T1_SRCC_36 (io), AV33 IO_0_VRN_36 (io), AW26 IO_L10N_T1_AD15N_35 (io), AW28 IO_L9P_T1_DQS_AD7P_35 (io), AW29 IO_L9N_T1_DQS_AD7N_35 (io), AW30 IO_L8P_T1_36 (io), AW31 IO_L10N_T1_36 (io), AW32 VCCO_36 (power), AW33 IO_L7P_T1_36 (io), AY26 IO_L8P_T1_AD14P_35 (io), AY27 IO_L8N_T1_AD14N_35 (io), AY28 IO_L7P_T1_AD6P_35 (io), AY29 VCCO_35 (power), AY30 IO_L8N_T1_36 (io), AY31 IO_L9P_T1_DQS_36 (io), AY32 IO_L9N_T1_DQS_36 (io), AY33 IO_L7N_T1_36 (io), BA26 VCCO_35 (power), BA27 IO_L5P_T0_AD13P_35 (io), BA28 IO_L5N_T0_AD13N_35 (io), BA29 IO_L7N_T1_AD6N_35 (io), BA30 IO_L6P_T0_36 (io), BA32 IO_L5P_T0_36 (io), BA33 IO_L5N_T0_36 (io), BB26 IO_L3P_T0_DQS_AD5P_35 (io), BB27 IO_L3N_T0_DQS_AD5N_35 (io), BB29 IO_L2P_T0_AD12P_35 (io), BB30 IO_L6N_T0_VREF_36 (io), BB31 IO_L3P_T0_DQS_36 (io), BB32 IO_L3N_T0_DQS_36 (io), BB33 VCCO_36 (power), BC26 IO_L1P_T0_AD4P_35 (io), BC27 IO_L6P_T0_35 (io), BC28 IO_L6N_T0_VREF_35 (io), BC29 IO_L2N_T0_AD12N_35 (io), BC30 VCCO_36 (power), BC31 IO_L2P_T0_36 (io), BC32 IO_L2N_T0_36 (io), BC33 IO_L1P_T0_36 (io), BD26 IO_L1N_T0_AD4N_35 (io), BD27 VCCO_35 (power), BD28 IO_L4P_T0_35 (io), BD29 IO_L4N_T0_35 (io), BD30 IO_L4P_T0_36 (io), BD31 IO_L4N_T0_36 (io), BD33 IO_L1N_T0_36 (io)